# Altium footprint library Connector.PcbLib: 231 footprints (part 9 of 15)
Each footprint in its own frame and in the unit in brackets; x right, y up, seen from the top. Pads: shape width x height; smd on the part's side, far side on the other; paste and mask are expansions set on the pad; w line width, h text height; cw(c..) or ccw(c..) is an arc to the next point about the centre after c.
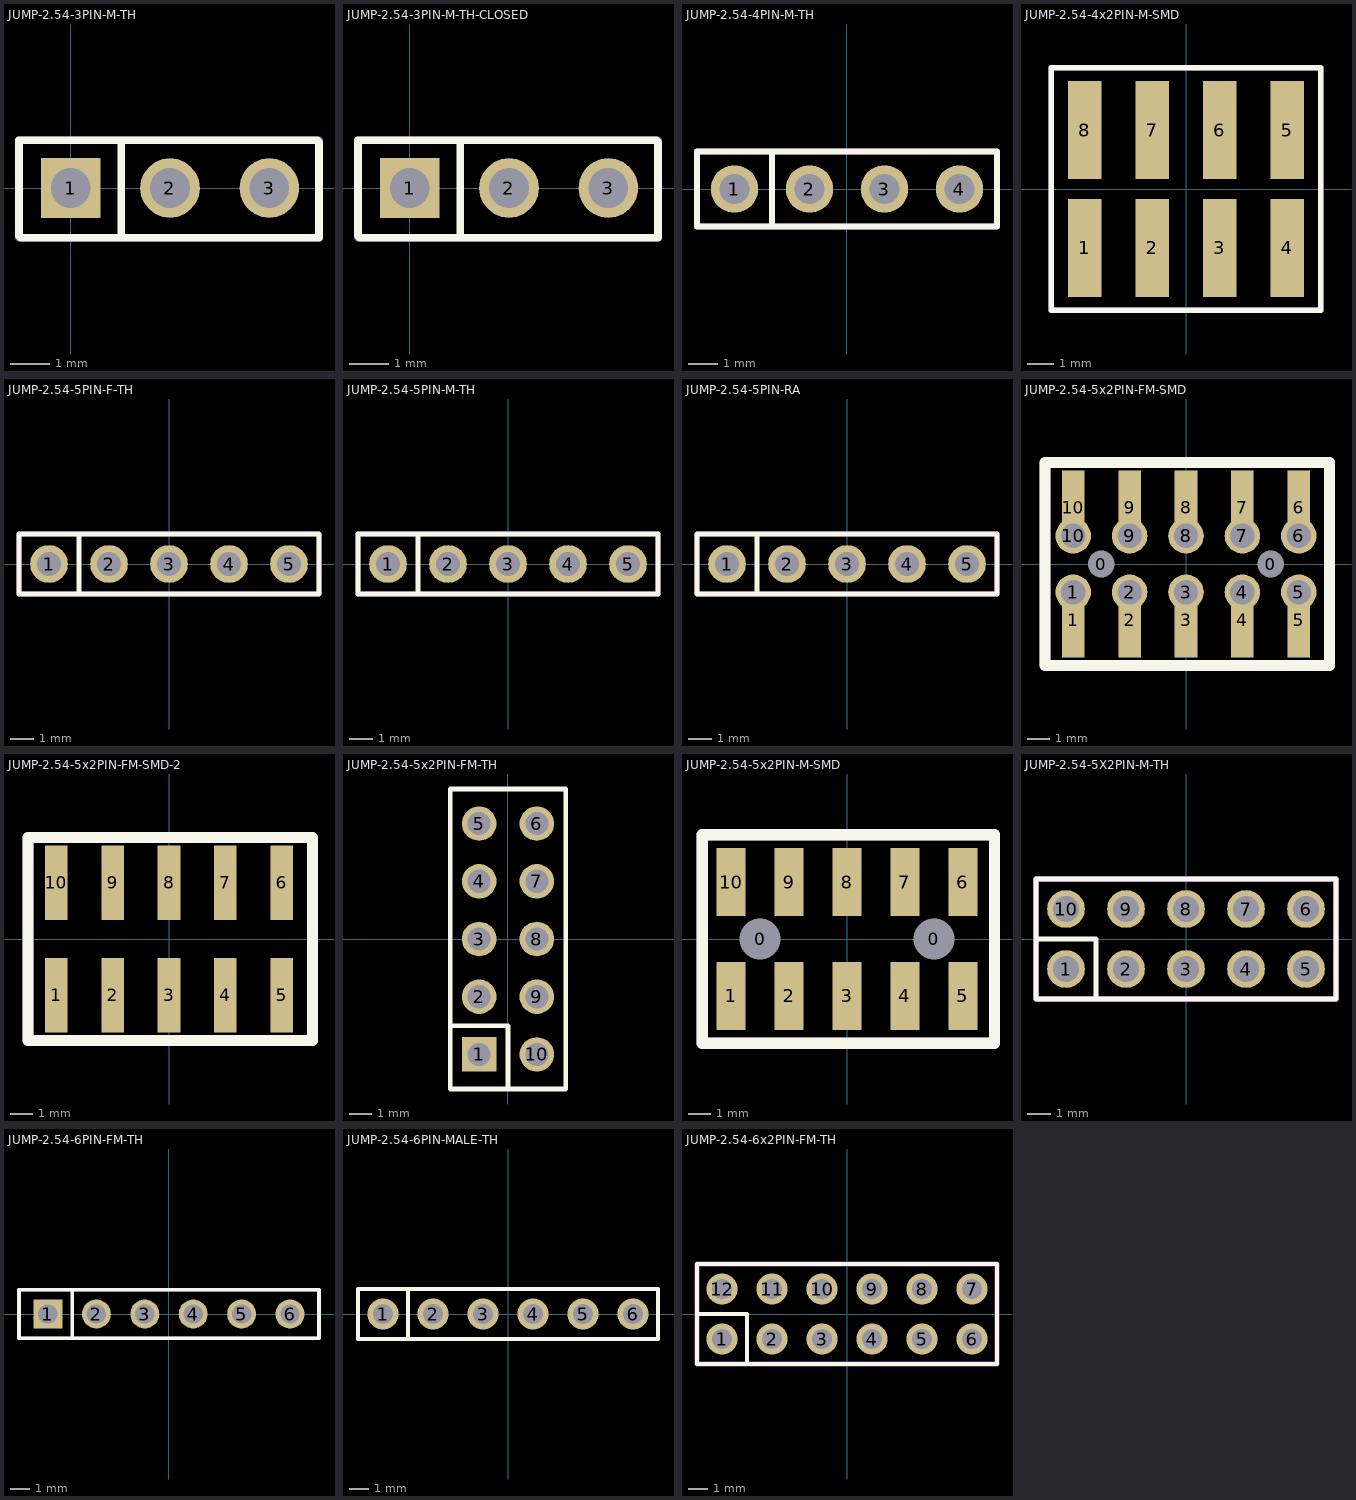
[diagram p8: the footprints below, top view; thin cyan lines are the x and y axes]

## JUMP-2.54-3PIN-M-TH [mil]
pads (3):
  rect 60x60 hole 40: 1(0,0)
  round 60 hole 40: 2(100,0) 3(200,0)
Top Overlay:
  lines w7.87: 51,-50 51,48 ; -52,-48 -50,-50 250,-50 250,46 248,48 -52,48 -52,-48
Mechanical 13:
  lines w7.87: -52,-48 -50,-50 250,-50 250,46 248,48 -52,48 -52,-48
  text ".Designator" at -45,-19 h59.06
Mechanical 15:
  lines w7.87: -52,-50 249,-50 250,-50 250,48 -52,48 -52,-50
  text ".Comment" at -30,-15 h59.06
3D body: height 300, standoff -120, extent -15,-15.25 15,14.75
3D body: height 300, standoff -120, extent 85,-15.25 115,14.75
3D body: height 300, standoff -120, extent 185,-15 215,15
3D body: height 100, standoff 0, extent -49.93,-50 250,50

## JUMP-2.54-3PIN-M-TH-CLOSED [mil]
pads (3):
  rect 60x60 hole 40: 1(0,0)
  round 60 hole 40: 2(100,0) 3(200,0)
Top Overlay:
  lines w7.87: 51,-50 51,48 ; -52,-48 -50,-50 250,-50 250,46 248,48 -52,48 -52,-48
Mechanical 13:
  lines w7.87: -52,-48 -50,-50 250,-50 250,46 248,48 -52,48 -52,-48
  text ".Designator" at -45,-19 h59.06
Mechanical 15:
  lines w7.87: -52,-50 249,-50 250,-50 250,48 -52,48 -52,-50
  text ".Comment" at -30,-15 h59.06
3D body: height 300, standoff -120, extent -15,-15.25 15,14.75
3D body: height 300, standoff -120, extent 85,-15.25 115,14.75
3D body: height 300, standoff -120, extent 185,-15 215,15
3D body: height 100, standoff 0, extent -49.93,-50 250,50
3D body: height 220, standoff 100, extent -52,-48 148,48
3D body: height 250, standoff 220, extent -44,-40 139.5,41
3D body: height 280, standoff 250, extent -52,-48 148,48

## JUMP-2.54-4PIN-M-TH [mm]
pads (4):
  round 1.6 hole 1.02: 1(-3.81,0) 2(-1.27,0) 3(1.27,0) 4(3.81,0)
Top Overlay:
  lines w0.2: -2.54,-1.27 -2.54,1.27 ; -5.08,-1.27 -5.08,1.27 5.08,1.27 5.08,-1.27 -5.08,-1.27
Mechanical 13:
  lines w0.2: -5.08,-1.27 5.08,-1.27 5.08,1.27 -5.08,1.27 -5.08,-1.27
  text ".Designator" at -3.302,-0.762 h1.5
Mechanical 15:
  lines w0.2: -5.08,-1.27 -5.08,1.27 5.08,1.27 5.08,-1.27 -5.08,-1.27
  text ".Comment" at -3.81,-0.508 h1.5
3D body "61300411121.stp": height 8.54, standoff -3, extent -5.08,-1.27 5.08,1.27

## JUMP-2.54-4x2PIN-M-SMD [mm]
pads (8):
  rect 1.27x3.68 smd: 1(-3.81,-2.22) 2(-1.27,-2.22) 3(1.27,-2.22) 4(3.81,-2.22) 5(3.81,2.22) 6(1.27,2.22) 7(-1.27,2.22) 8(-3.81,2.22)
Top Overlay:
  lines w0.2: -5.08,3.048 -5.08,4.572 5.07,4.572 5.07,-4.572 -5.08,-4.572 -5.08,3.493
Mechanical 13:
  lines w0.2: -5.08,3.048 -5.08,4.572 5.07,4.572 5.07,-4.572 -5.08,-4.572 -5.08,3.493
  text ".Designator" at -4.7,-0.6 h2
Mechanical 15:
  lines w0.2: -5.08,3.048 -5.08,4.572 5.07,4.572 5.07,-4.572 -5.08,-4.572 -5.08,3.493
  text ".Comment" at -4.33,-0.4 h2

## JUMP-2.54-5PIN-F-TH [mm]
pads (5):
  round 1.6 hole 1.02: 1(-5.08,0) 2(-2.54,0) 3(0,0) 4(2.54,0) 5(5.08,0)
Top Overlay:
  lines w0.2: -3.81,-1.27 -3.81,1.27 ; -6.35,-1.27 -6.35,1.27 6.35,1.27 6.35,-1.27 -6.35,-1.27
Mechanical 13:
  lines w0.2: -6.35,-1.27 -6.35,1.27 6.35,1.27 6.35,-1.27 -6.35,-1.27
  text ".Designator" at -3.302,-0.635 h1.5
Mechanical 15:
  lines w0.2: -6.35,-1.27 -6.35,1.27 6.35,1.27 6.35,-1.27 -6.35,-1.27
  text ".Comment" at -3.302,-0.381 h1.5
3D body "5P F 3D.step": height 10.1, standoff -1.55, extent -6.575,-1.27 6.625,1.231

## JUMP-2.54-5PIN-M-TH [mm]
pads (5):
  round 1.6 hole 1.02: 1(-5.08,0) 2(-2.54,0) 3(0,0) 4(2.54,0) 5(5.08,0)
Top Overlay:
  lines w0.2: -3.81,-1.27 -3.81,1.27 ; -6.35,-1.27 6.35,-1.27 6.35,1.27 -6.35,1.27 -6.35,-1.27
Mechanical 13:
  lines w0.2: -6.35,-1.27 6.35,-1.27 6.35,1.27 -6.35,1.27 -6.35,-1.27
  text ".Designator" at -3.302,-0.635 h1.5
Mechanical 15:
  lines w0.2: -6.35,-1.27 6.35,-1.27 6.35,1.27 -6.35,1.27 -6.35,-1.27
  text ".Comment" at -3.302,-0.381 h1.5
3D body "61300511121.stp": height 8.54, standoff -3, extent -6.35,-1.27 6.35,1.27

## JUMP-2.54-5PIN-RA [mm]
pads (5):
  round 1.6 hole 1.02: 1(-5.08,0) 2(-2.54,0) 3(0,0) 4(2.54,0) 5(5.08,0)
Top Overlay:
  lines w0.2: -3.81,-1.27 -3.81,1.27 ; -6.35,-1.27 -6.35,1.27 6.35,1.27 6.35,-1.27 -6.35,-1.27
Mechanical 13:
  lines w0.2: -6.35,-1.27 -6.35,1.27 6.35,1.27 6.35,-1.27 -6.35,-1.27
  text ".Designator" at -3.302,-0.635 h1.5
Mechanical 15:
  lines w0.2: -6.35,-1.27 -6.35,1.27 6.35,1.27 6.35,-1.27 -6.35,-1.27
  text ".Comment" at -3.302,-0.381 h1.5
3D body "5p cong 3d.step": height 2.6, standoff -2.9, extent -6.355,-10.095 6.355,0.305

## JUMP-2.54-5x2PIN-FM-SMD [mm]
pads (22):
  round 1 hole 1.2 unplated: 0(-3.81,0) 0(3.81,0)
  rect 1.02x3.35 smd: 1(-5.08,-2.525) 2(-2.54,-2.525) 3(0,-2.525) 4(2.54,-2.525) 5(5.08,-2.525) 6(5.08,2.525) 7(2.54,2.525) 8(0,2.525) 9(-2.54,2.525) 10(-5.08,2.525)
  round 1.6 hole 1.1: 1(-5.08,-1.27) 2(-2.54,-1.27) 3(0,-1.27) 4(2.54,-1.27) 5(5.08,-1.27) 6(5.08,1.27) 7(2.54,1.27) 8(0,1.27) 9(-2.54,1.27) 10(-5.08,1.27)
Top Overlay:
  lines w0.5: -6.35,3.048 -6.35,4.572 6.47,4.572 6.47,-4.572 -6.35,-4.572 -6.35,3.493
Mechanical 13:
  lines w0.5: -6.35,3.048 -6.35,4.572 6.47,4.572 6.47,-4.572 -6.35,-4.572 -6.35,3.493
  text ".Designator" at -4.6,-0.8 h2
Mechanical 15:
  lines w0.5: -6.35,3.048 -6.35,4.572 6.47,4.572 6.47,-4.572 -6.35,-4.572 -6.35,3.493
  text ".Comment" at -4.6,-0.4 h2
3D body "SSM-105-L-DV-TR.stp": height 7.37, standoff -0.05, extent -6.35,-3.518 6.35,3.518

## JUMP-2.54-5x2PIN-FM-SMD-2 [mm]
pads (10):
  rect 1.02x3.35 smd: 1(-5.08,-2.525) 2(-2.54,-2.525) 3(0,-2.525) 4(2.54,-2.525) 5(5.08,-2.525) 6(5.08,2.525) 7(2.54,2.525) 8(0,2.525) 9(-2.54,2.525) 10(-5.08,2.525)
Top Overlay:
  lines w0.5: -6.35,3.048 -6.35,4.572 6.47,4.572 6.47,-4.572 -6.35,-4.572 -6.35,3.493
Mechanical 13:
  lines w0.5: -6.35,3.048 -6.35,4.572 6.47,4.572 6.47,-4.572 -6.35,-4.572 -6.35,3.493
  text ".Designator" at -4.6,-0.8 h2
Mechanical 15:
  lines w0.5: -6.35,3.048 -6.35,4.572 6.47,4.572 6.47,-4.572 -6.35,-4.572 -6.35,3.493
  text ".Comment" at -4.6,-0.4 h2
3D body "SSM-105-L-DV-TR.stp": height 7.37, standoff -0.05, extent -6.35,-3.518 6.35,3.518

## JUMP-2.54-5x2PIN-FM-TH [mm]
pads (10):
  rect 1.52x1.52 hole 1.02: 1(-1.25,-5.08)
  round 1.52 hole 1.02: 2(-1.25,-2.54) 3(-1.25,0) 4(-1.25,2.54) 5(-1.25,5.08) 6(1.29,5.08) 7(1.29,2.54) 8(1.29,0) 9(1.29,-2.54) 10(1.29,-5.08)
Top Overlay:
  lines w0.2: -2.52,-3.81 0.02,-3.81 0.02,-6.6 ; -2.52,-6.6 2.56,-6.6 2.56,-1.27 2.56,6.6 -2.52,6.6 -2.52,-6.6
3D body "61301021821.stp": height 8.51, standoff -3.09, extent -2.52,-6.6 2.56,6.6

## JUMP-2.54-5x2PIN-M-SMD [mm]
pads (12):
  round 1 hole 1.8 unplated: 0(-3.81,0) 0(3.81,0)
  rect 1.27x3 smd: 1(-5.08,-2.5) 2(-2.54,-2.5) 3(0,-2.5) 4(2.54,-2.5) 5(5.08,-2.5) 6(5.08,2.5) 7(2.54,2.5) 8(0,2.5) 9(-2.54,2.5) 10(-5.08,2.5)
Top Overlay:
  lines w0.5: -6.35,3.048 -6.35,4.572 6.47,4.572 6.47,-4.572 -6.35,-4.572 -6.35,3.493
Mechanical 13:
  lines w0.5: -6.35,3.048 -6.35,4.572 6.47,4.572 6.47,-4.572 -6.35,-4.572 -6.35,3.493
  text ".Designator" at -4.6,-0.8 h2
Mechanical 15:
  lines w0.5: -6.35,3.048 -6.35,4.572 6.47,4.572 6.47,-4.572 -6.35,-4.572 -6.35,3.493
  text ".Comment" at -4.6,-0.4 h2
3D body "015916102.stp": height 9.78, standoff 0.13, extent -6.35,-3.492 6.35,3.493

## JUMP-2.54-5X2PIN-M-TH [mm]
pads (10):
  round 1.6 hole 1.1: 1(-5.08,-1.27) 2(-2.54,-1.27) 3(0,-1.27) 4(2.54,-1.27) 5(5.08,-1.27) 6(5.08,1.27) 7(2.54,1.27) 8(0,1.27) 9(-2.54,1.27) 10(-5.08,1.27)
Top Overlay:
  lines w0.2: -6.35,0 -3.81,0 -3.81,-2.54 ; -6.35,-2.54 -6.35,2.54 -1.27,2.54 6.35,2.54 6.35,-2.54 -6.35,-2.54
Mechanical 13:
  lines w0.254: -6.35,-2.54 -6.35,2.54 6.35,2.54 6.35,-2.54 -6.35,-2.54
  text ".Designator" at -3.2,-0.305 h1.5
Mechanical 15:
  lines w0.254: -6.35,-2.54 -6.35,2.54 6.35,2.54 6.35,-2.54 -6.35,-2.54
  text ".Comment" at -3.2,-0.305 h1.5
3D body "61301021121.stp": height 8.55, standoff -2.99, extent -6.35,-2.54 6.35,2.54

## JUMP-2.54-6PIN-FM-TH [mm] "6 row, straight, gold plating"
height 8.5
pads (6):
  rect 1.52x1.52 hole 1.02: 1(-6.35,0)
  round 1.52 hole 1.02: 2(-3.81,0) 3(-1.27,0) 4(1.27,0) 5(3.81,0) 6(6.35,0)
Top Overlay:
  lines w0.2: -5.08,-1.27 -5.08,1.27 ; -7.87,-1.27 -7.87,1.27 7.87,1.27 7.87,-1.27 -7.87,-1.27
Mechanical 13:
  lines w0.2: -7.87,-1.27 7.87,-1.27 7.87,1.27 -7.87,1.27 -7.87,-1.27
  text ".Designator" at -2.85,-0.25 h1.5
Mechanical 15:
  lines w0.2: -7.87,-1.27 7.87,-1.27 7.87,1.27 -7.87,1.27 -7.87,-1.27
  text ".Comment" at -2.85,-0.25 h1.5
3D body "61300611821.stp": height 8.51, standoff -3.09, extent -7.87,-1.25 7.87,1.25

## JUMP-2.54-6PIN-MALE-TH [mm] "6 pins, 1 row, straight, gold plating"
height 8.54
pads (6):
  round 1.6 hole 1.02: 1(-6.35,0) 2(-3.81,0) 3(-1.27,0) 4(1.27,0) 5(3.81,0) 6(6.35,0)
Top Overlay:
  lines w0.2: -5.08,-1.27 -5.08,1.27 ; -7.62,-1.27 -7.62,1.27 7.62,1.27 7.62,-1.27 -7.62,-1.27
Mechanical 13:
  lines w0.2: -7.62,-1.27 7.62,-1.27 7.62,1.27 -7.62,1.27 -7.62,-1.27
  text ".Designator" at -2.6,-0.25 h1.5
Mechanical 15:
  lines w0.2: -7.62,-1.27 7.62,-1.27 7.62,1.27 -7.62,1.27 -7.62,-1.27
  text ".Comment" at -2.6,-0.25 h1.5
3D body "61300611121.stp": height 8.54, standoff -3, extent -7.62,-1.27 7.62,1.27

## JUMP-2.54-6x2PIN-FM-SMD [mm]

## JUMP-2.54-6x2PIN-FM-TH [mm]
pads (12):
  round 1.6 hole 1: 1(-6.35,-1.27) 2(-3.81,-1.27) 3(-1.27,-1.27) 4(1.27,-1.27) 5(3.81,-1.27) 6(6.35,-1.27) 7(6.35,1.27) 8(3.81,1.27) 9(1.27,1.27) 10(-1.27,1.27) 11(-3.81,1.27) 12(-6.35,1.27)
Top Overlay:
  lines w0.2: -7.62,0 -5.08,0 -5.08,-2.54 ; -7.62,-2.54 -7.62,2.54 -2.54,2.54 7.62,2.54 7.62,-2.54 -7.62,-2.54
Mechanical 13:
  lines w0.254: -7.62,-2.54 -7.62,2.54 7.62,2.54 7.62,-2.54 -7.62,-2.54
  text ".Designator" at -4.47,-0.305 h1.5
Mechanical 15:
  lines w0.254: -7.62,-2.54 -7.62,2.54 7.62,2.54 7.62,-2.54 -7.62,-2.54
  text ".Comment" at -4.47,-0.305 h1.5
3D body "5-534206-6.stp": height 8.64, standoff -4.32, extent -7.62,-2.54 7.62,2.54